# Altium footprint library Connectors THD.PcbLib: 631 footprints (part 24 of 46)
Each footprint in its own frame and in the unit in brackets; x right, y up, seen from the top. Pads: shape width x height; smd on the part's side, far side on the other; paste and mask are expansions set on the pad; w line width, h text height; cw(c..) or ccw(c..) is an arc to the next point about the centre after c.
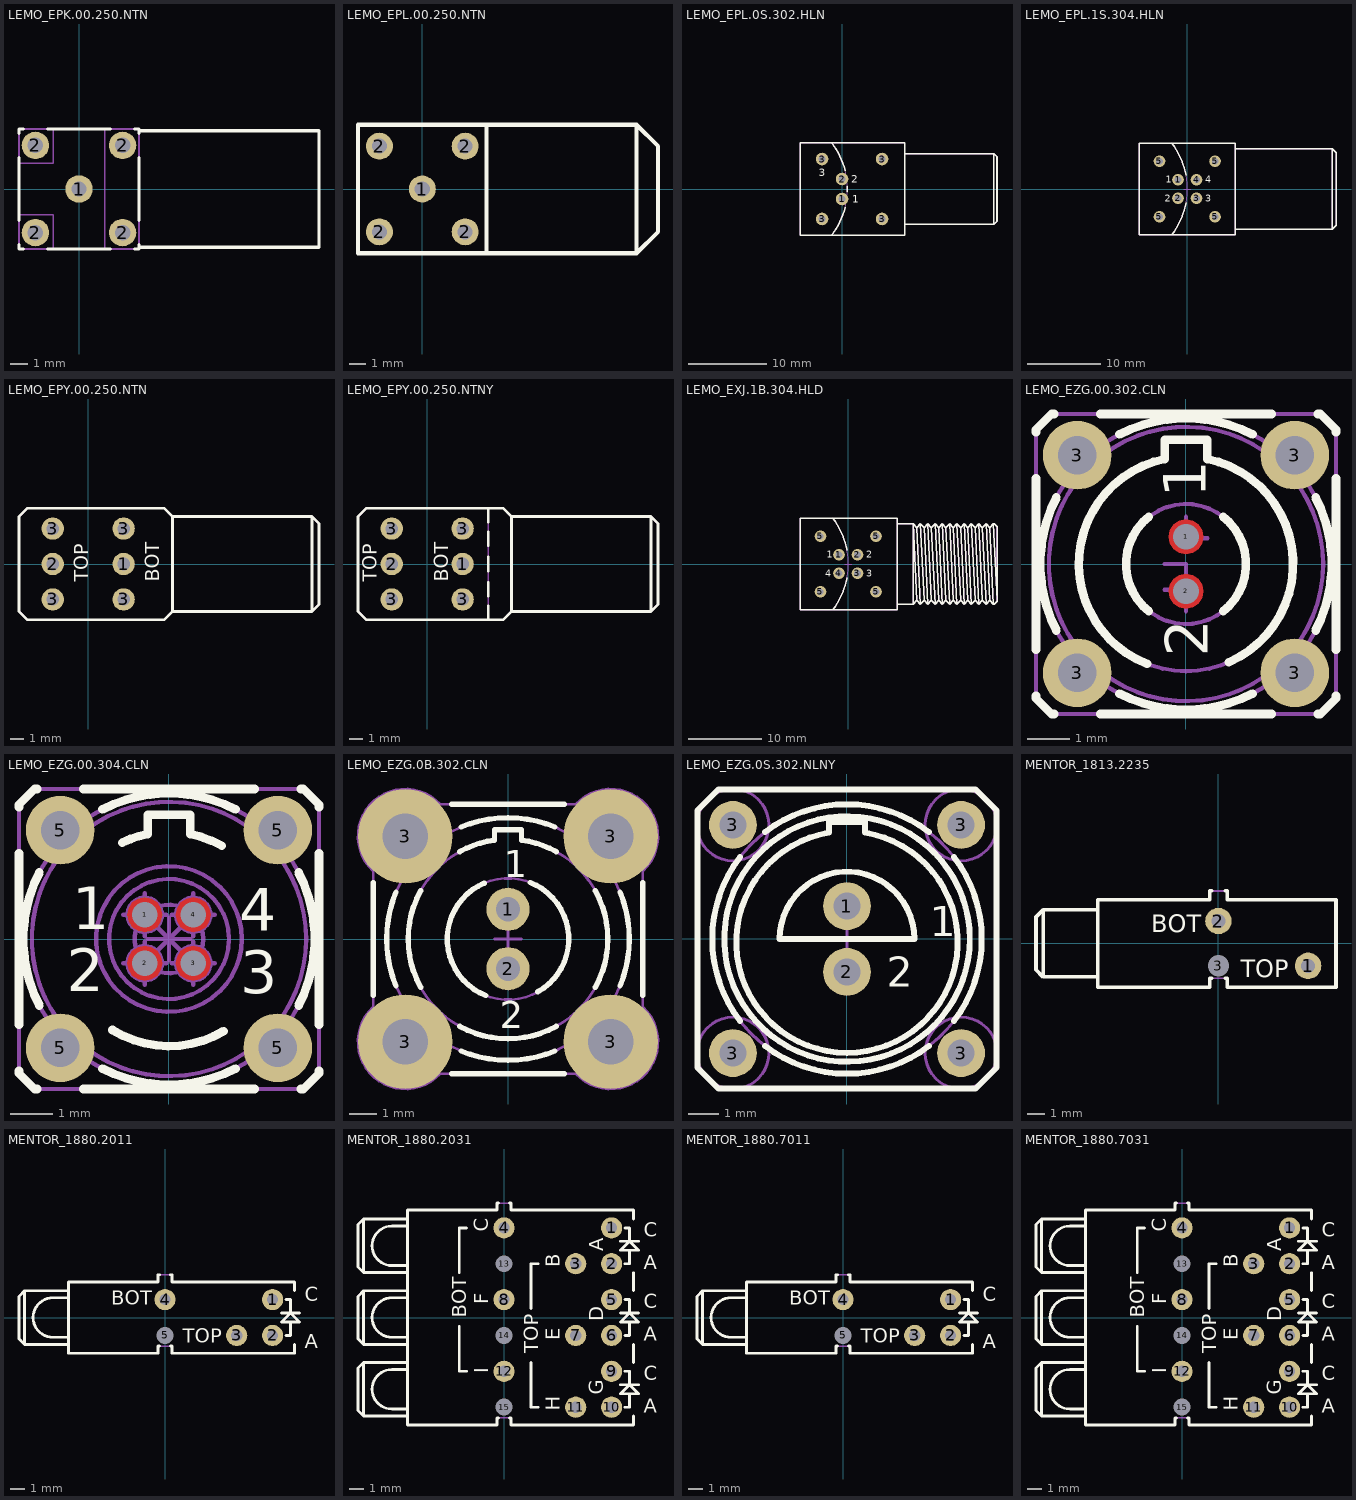
[diagram p23: the footprints below, top view; thin cyan lines are the x and y axes]

## LEMO_EPK.00.250.NTN [mm] "50 Ohm size 00 Coaxial Elbow (90°) socket"
height 7
pads (5):
  round 1.6 hole 0.9: 1(0,0) 2(-2.54,-2.54) 2(-2.54,2.54) 2(2.54,-2.54) 2(2.54,2.54)
Top Overlay:
  lines w0.2: -3.5,-3.26 -3.5,-3.5 -3.26,-3.5 ; -3.5,-1.82 -3.5,1.82 ; -3.5,3.26 -3.5,3.5 -3.26,3.5 ; -1.82,-3.5 1.82,-3.5 ; -1.82,3.5 1.82,3.5 ; 3.26,-3.5 3.5,-3.5 3.5,-3.26 ; 3.26,3.5 3.5,3.5 3.5,3.26 ; 3.5,-3.4 14,-3.4 14,3.4 3.5,3.4 ; 3.5,-1.82 3.5,1.82
Mechanical 8:
  lines w0.1: -3.04,-2.54 -2.54,-2.54 ; -3.04,2.54 -2.54,2.54 ; -2.54,-3.04 -2.54,-2.54 ; -2.54,-2.04 -2.54,-2.54 ; -2.54,2.04 -2.54,2.54 ; -2.54,3.04 -2.54,2.54 ; -2.04,-2.54 -2.54,-2.54 ; -2.04,2.54 -2.54,2.54 ; -0.5,0 0,0 ; 0,-0.5 0,0 ; 0,0.5 0,0 ; 0.5,0 0,0 ; 2.04,-2.54 2.54,-2.54 ; 2.04,2.54 2.54,2.54 ; 2.54,-3.04 2.54,-2.54 ; 2.54,-2.04 2.54,-2.54 ; 2.54,2.04 2.54,2.54 ; 2.54,3.04 2.54,2.54 ; 3.04,-2.54 2.54,-2.54 ; 3.04,2.54 2.54,2.54 ; -3.5,-3.5 -3.5,-1.5 -1.5,-1.5 -1.5,-3.5 -3.5,-3.5 ; -3.5,1.5 -3.5,3.5 -1.5,3.5 -1.5,1.5 -3.5,1.5 ; 1.5,-3.5 3.5,-3.5 3.5,3.5 1.5,3.5 1.5,-3.5
Mechanical 14:
  lines w0.1: 1.5,-3.5 3.5,-3.5 ; 3.5,-3.4 14,-3.4 14,3.4 3.5,3.4 ; 3.5,-3.5 3.5,3.5 ; 3.5,-3.5 -3.5,-3.5 -3.5,3.5 3.5,3.5 ; 3.5,-3.5 3.5,3.5
3D body: height 7, standoff -3, extent -3.5,-3.5 14,3.5

## LEMO_EPL.00.250.NTN [mm] "50 Ohm size 00 Coaxial Elbow (90°) socket"
height 7
pads (5):
  round 1.6 hole 0.9: 1(0,0) 2(-2.54,-2.54) 2(-2.54,2.54) 2(2.54,-2.54) 2(2.54,2.54)
Top Overlay:
  lines w0.254: 3.81,-3.81 -3.81,-3.81 -3.81,3.81 3.81,3.81 ; 3.81,-3.81 3.81,3.81 ; 3.81,-3.81 12.7,-3.81 ; 3.81,3.81 12.7,3.81 ; 12.7,-3.81 12.7,3.81 ; 12.7,-3.81 13.97,-2.54 13.97,2.54 12.7,3.81
Mechanical 14:
  lines w0.1: 3.81,-3.81 12.7,-3.81 ; 3.81,-3.81 -3.81,-3.81 -3.81,3.81 3.81,3.81 ; 3.81,-3.81 3.81,3.81 ; 3.81,3.81 12.7,3.81 ; 12.7,-3.81 12.7,3.81 ; 12.7,-3.81 13.97,-2.54 13.97,2.54 12.7,3.81
3D body: height 7, standoff -3, extent -3.5,-3.5 14,3.5

## LEMO_EPL.0S.302.HLN [mm] "Elbow Receptacle (90°) With 1 Female + 1 Male Contacts and Hermaphroditic Keying"
height 12.7
pads (6):
  round 1.6 hole 0.9: 1(0,-1.27) 2(0,1.27) 3(-2.54,-3.81) 3(-2.54,3.81) 3(5.08,-3.81) 3(5.08,3.81)
Top Overlay:
  lines w0.2: -1.32,-5.85 ccw(c-8.876,0) 0.386,-2.353 ; -1.32,5.85 cw(c-8.876,0) 0.386,2.353 ; 0.674,-0.338 ccw(c-8.876,0) 0.674,0.338 ; 7.98,-4.5 19.28,-4.5 ; 7.98,4.5 19.28,4.5 ; 19.28,-4.5 19.68,-4.1 19.68,4.1 19.28,4.5 ; 19.28,-4.5 19.28,4.5 ; -5.32,-5.85 -5.32,5.85 7.98,5.85 7.98,-5.85 -5.32,-5.85
  text "3" at -2.975,1.625 h0.97
  text "2" at 1.186,0.787 h0.97
  text "1" at 1.275,-1.75 h0.97
Mechanical 14:
  circle w0.1: c0,1.27 r0.4
  circle w0.1: c0,-1.27 r0.4
  circle w0.1: c-2.54,-3.81 r0.4
  circle w0.1: c5.08,-3.81 r0.4
  circle w0.1: c5.08,3.81 r0.4
  circle w0.1: c-2.54,3.81 r0.4
  lines w0.1: -1.32,-5.85 ccw(c-8.876,0) -1.32,5.85 ; 7.98,-4.5 19.28,-4.5 ; 7.98,4.5 19.28,4.5 ; 19.28,-4.5 19.68,-4.1 19.68,4.1 19.28,4.5 ; 19.28,-4.5 19.28,4.5 ; -5.32,-5.85 -5.32,5.85 7.98,5.85 7.98,-5.85 -5.32,-5.85
  text "3" at -2.975,1.625 h0.97
  text "2" at 1.186,0.787 h0.97
  text "1" at 1.275,-1.75 h0.97
3D body: height 12.7, standoff -4, extent -5.32,-5.85 19.68,5.85

## LEMO_EPL.1S.304.HLN [mm] "Elbow Socket (90°) With 2 Female + 2 Male Contacts For PCB, Serie 1S"
height 14
pads (8):
  round 1.6 hole 0.9: 1(-1.27,1.27) 2(-1.27,-1.27) 3(1.27,-1.27) 4(1.27,1.27) 5(-3.81,-3.81) 5(-3.81,3.81) 5(3.81,-3.81) 5(3.81,3.81)
Top Overlay:
  lines w0.2: -2.132,-6.3 ccw(c-10.375,0) -0.169,-1.861 ; -2.132,6.3 cw(c-10.375,0) -0.169,1.861 ; 6.6,-5.5 19.9,-5.5 ; 6.6,5.5 19.9,5.5 ; 19.9,-5.5 20.4,-5 20.4,5 19.9,5.5 ; 19.9,-5.5 19.9,5.5 ; -6.6,-6.3 -6.6,6.3 6.6,6.3 6.6,-6.3 -6.6,-6.3
  text "1" at -2.932,0.827 h0.97
  text "4" at 2.48,0.827 h0.97
  text "2" at -3.12,-1.748 h0.97
  text "3" at 2.477,-1.717 h0.97
Mechanical 8:
  lines w0.1: -4.31,-3.81 -3.81,-3.81 ; -4.31,3.81 -3.81,3.81 ; -3.81,-4.31 -3.81,-3.81 ; -3.81,-3.31 -3.81,-3.81 ; -3.81,3.31 -3.81,3.81 ; -3.81,4.31 -3.81,3.81 ; -3.31,-3.81 -3.81,-3.81 ; -3.31,3.81 -3.81,3.81 ; -1.77,-1.27 -1.27,-1.27 ; -1.77,1.27 -1.27,1.27 ; -1.27,-1.77 -1.27,-1.27 ; -1.27,-0.77 -1.27,-1.27 ; -1.27,0.77 -1.27,1.27 ; -1.27,1.77 -1.27,1.27 ; -0.77,-1.27 -1.27,-1.27 ; -0.77,1.27 -1.27,1.27 ; -0.5,0 0,0 ; 0,-0.5 0,0 ; 0,0.5 0,0 ; 0.5,0 0,0 ; 0.77,-1.27 1.27,-1.27 ; 0.77,1.27 1.27,1.27 ; 1.27,-1.77 1.27,-1.27 ; 1.27,-0.77 1.27,-1.27 ; 1.27,0.77 1.27,1.27 ; 1.27,1.77 1.27,1.27 ; 1.77,-1.27 1.27,-1.27 ; 1.77,1.27 1.27,1.27 ; 3.31,-3.81 3.81,-3.81 ; 3.31,3.81 3.81,3.81 ; 3.81,-4.31 3.81,-3.81 ; 3.81,-3.31 3.81,-3.81 ; 3.81,3.31 3.81,3.81 ; 3.81,4.31 3.81,3.81 ; 4.31,-3.81 3.81,-3.81 ; 4.31,3.81 3.81,3.81
Mechanical 14:
  lines w0.1: -2.132,-6.3 ccw(c-10.375,0) -2.132,6.3 ; 6.6,-5.5 19.9,-5.5 ; 6.6,5.5 19.9,5.5 ; 19.9,-5.5 20.4,-5 20.4,5 19.9,5.5 ; 19.9,-5.5 19.9,5.5 ; -6.6,-6.3 -6.6,6.3 6.6,6.3 6.6,-6.3 -6.6,-6.3
  text "1" at -2.932,0.827 h0.97
  text "4" at 2.48,0.827 h0.97
  text "2" at -3.12,-1.748 h0.97
  text "3" at 2.477,-1.717 h0.97
3D body: height 14, standoff -4, extent -6.6,-6.3 20.4,6.3

## LEMO_EPY.00.250.NTN [mm] "Dual 50 ohms Size 00 Coaxial Elbow Sockets (90°)"
height 14.8
pads (6):
  round 1.6 hole 0.9: 1(2.54,0) 2(-2.54,0) 3(-2.54,-2.54) 3(-2.54,2.54) 3(2.54,-2.54) 3(2.54,2.54)
Top Overlay:
  lines w0.2: 6.04,-3.4 16.04,-3.4 ; 6.04,-3.4 6.04,3.4 ; 6.04,-3.4 5.44,-4 -4.36,-4 -4.96,-3.4 -4.96,3.4 -4.36,4 5.44,4 6.04,3.4 ; 6.04,3.4 16.04,3.4 ; 16.04,-3.4 16.04,3.4 ; 16.04,-3.4 16.54,-2.9 16.54,2.9 16.04,3.4
  text "TOP" at 0,-1.27 h1
  text "BOT" at 5.08,-1.27 h1
Mechanical 14:
  lines w0.1: 6.04,-3.4 16.04,-3.4 ; 6.04,-3.4 6.04,3.4 ; 6.04,-3.4 5.44,-4 -4.36,-4 -4.96,-3.4 -4.96,3.4 -4.36,4 5.44,4 6.04,3.4 ; 6.04,3.4 16.04,3.4 ; 16.04,-3.4 16.04,3.4 ; 16.04,-3.4 16.54,-2.9 16.54,2.9 16.04,3.4
  text "TOP" at 0,-1.27 h1
  text "BOT" at 5.08,-1.27 h1
3D body: height 14.8, standoff -3, extent -4.96,-4 16.54,4

## LEMO_EPY.00.250.NTNY [mm] "Dual 50 ohms Low Profile Size 00 Coaxial Elbow Sockets (90°)"
height 13.7
pads (6):
  round 1.6 hole 0.9: 1(2.54,0) 2(-2.54,0) 3(-2.54,-2.54) 3(-2.54,2.54) 3(2.54,-2.54) 3(2.54,2.54)
Top Overlay:
  lines w0.2: 4.37,-4 4.37,-3 ; 4.37,-2.318 4.37,-1.318 ; 4.37,-0.5 4.37,0.5 ; 4.37,1.318 4.37,2.318 ; 4.37,3 4.37,4 ; 6.04,-3.4 5.44,-4 -4.36,-4 -4.96,-3.4 -4.96,3.4 -4.36,4 5.44,4 6.04,3.4 ; 6.04,-3.4 6.04,3.4 ; 6.04,-3.4 16.04,-3.4 ; 6.04,3.4 16.04,3.4 ; 16.04,-3.4 16.54,-2.9 16.54,2.9 16.04,3.4 ; 16.04,-3.4 16.04,3.4
  text "BOT" at 1.51,-1.27 h1
  text "TOP" at -3.6,-1.27 h1
Mechanical 14:
  lines w0.1: 4.37,-4 4.37,4 ; 6.04,-3.4 5.44,-4 -4.36,-4 -4.96,-3.4 -4.96,3.4 -4.36,4 5.44,4 6.04,3.4 ; 6.04,-3.4 6.04,3.4 ; 6.04,-3.4 16.04,-3.4 ; 6.04,3.4 16.04,3.4 ; 16.04,-3.4 16.54,-2.9 16.54,2.9 16.04,3.4 ; 16.04,-3.4 16.04,3.4
  text "BOT" at 1.51,-1.27 h1
  text "TOP" at -3.6,-1.27 h1
3D body: height 13.7, standoff -3, extent -4.96,-4 16.54,4

## LEMO_EXJ.1B.304.HLD [mm] "Elbow Socket (90°) With 4 Male Contacts For PCB And Keys (J), Serie 1B"
height 14
pads (8):
  round 1.6 hole 0.9: 1(-1.27,1.27) 2(1.27,1.27) 3(1.27,-1.27) 4(-1.27,-1.27) 5(-3.81,-3.81) 5(-3.81,3.81) 5(3.81,-3.81) 5(3.81,3.81)
Top Overlay:
  lines w0.2: -2.132,-6.3 ccw(c-10.375,0) -0.169,-1.861 ; -2.132,6.3 cw(c-10.375,0) -0.169,1.861 ; 6.71,-5.5 8.91,-5.5 ; 6.71,5.5 8.91,5.5 ; 20.41,-5 19.91,5.5 ; 8.91,-5.5 9.41,-5 ; 8.91,-5.5 8.91,5.5 ; 8.91,5.5 9.41,5 ; 8.91,5.5 9.41,-5 ; 9.41,-5 9.91,-5.5 ; 9.41,5 9.91,5.5 ; 9.41,5 9.91,-5.5 ; 9.91,-5.5 10.41,-5 ; 9.91,5.5 10.41,5 ; 9.91,5.5 10.41,-5 ; 10.41,-5 10.91,-5.5 ; 10.41,5 10.91,5.5 ; 10.41,5 10.91,-5.5 ; 10.91,-5.5 11.41,-5 ; 10.91,5.5 11.41,5 ; 10.91,5.5 11.41,-5 ; 11.41,-5 11.91,-5.5 ; 11.41,5 11.91,5.5 ; 11.41,5 11.91,-5.5 ; 11.91,-5.5 12.41,-5 ; 11.91,5.5 12.41,5 ; 11.91,5.5 12.41,-5 ; 12.41,-5 12.91,-5.5 ; 12.41,5 12.91,5.5 ; 12.41,5 12.91,-5.5 ; 12.91,-5.5 13.41,-5 ; 12.91,5.5 13.41,5 ; 12.91,5.5 13.41,-5 ; 13.41,-5 13.91,-5.5 ; 13.41,5 13.91,5.5 ; 13.41,5 13.91,-5.5 ; 13.91,-5.5 14.41,-5 ; 13.91,5.5 14.41,5 ; 13.91,5.5 14.41,-5 ; 14.41,-5 14.91,-5.5 ; 14.41,5 14.91,5.5 ; 14.41,5 14.91,-5.5 ; 14.91,-5.5 15.41,-5 ; 14.91,5.5 15.41,5 ; 14.91,5.5 15.41,-5 ; 15.41,-5 15.91,-5.5 ; 15.41,5 15.91,5.5 ; 15.41,5 15.91,-5.5 ; 15.91,-5.5 16.41,-5 ; 15.91,5.5 16.41,5 ; 15.91,5.5 16.41,-5 ; 16.41,-5 16.91,-5.5 ; 16.41,5 16.91,5.5 ; 16.41,5 16.91,-5.5 ; 16.91,-5.5 17.41,-5 ; 16.91,5.5 17.41,5 ; 16.91,5.5 17.41,-5 ; 17.41,-5 17.91,-5.5 ; 17.41,5 17.91,5.5 ; 17.41,5 17.91,-5.5 ; 17.91,-5.5 18.41,-5 ; 17.91,5.5 18.41,5 ; 17.91,5.5 18.41,-5 ; 18.41,-5 18.91,-5.5 ; 18.41,5 18.91,5.5 ; 18.41,5 18.91,-5.5 ; 18.91,-5.5 19.41,-5 ; 18.91,5.5 19.41,5 ; 18.91,5.5 19.41,-5 ; 19.41,-5 19.91,-5.5 ; 19.41,5 19.91,5.5 ; 19.41,5 19.91,-5.5 ; 19.91,-5.5 20.01,-5.5 20.41,-5.1 20.41,5.1 20.01,5.5 19.91,5.5 ; -6.59,-6.3 6.71,-6.3 6.71,6.3 -6.59,6.3 -6.59,-6.3
  text "1" at -2.932,0.827 h0.97
  text "2" at 2.48,0.827 h0.97
  text "4" at -3.12,-1.748 h0.97
  text "3" at 2.477,-1.717 h0.97
Mechanical 8:
  lines w0.1: -4.31,-3.81 -3.81,-3.81 ; -4.31,3.81 -3.81,3.81 ; -3.81,-4.31 -3.81,-3.81 ; -3.81,-3.31 -3.81,-3.81 ; -3.81,3.31 -3.81,3.81 ; -3.81,4.31 -3.81,3.81 ; -3.31,-3.81 -3.81,-3.81 ; -3.31,3.81 -3.81,3.81 ; -1.77,-1.27 -1.27,-1.27 ; -1.77,1.27 -1.27,1.27 ; -1.27,-1.77 -1.27,-1.27 ; -1.27,-0.77 -1.27,-1.27 ; -1.27,0.77 -1.27,1.27 ; -1.27,1.77 -1.27,1.27 ; -0.77,-1.27 -1.27,-1.27 ; -0.77,1.27 -1.27,1.27 ; -0.5,0 0,0 ; 0,-0.5 0,0 ; 0,0.5 0,0 ; 0.5,0 0,0 ; 0.77,-1.27 1.27,-1.27 ; 0.77,1.27 1.27,1.27 ; 1.27,-1.77 1.27,-1.27 ; 1.27,-0.77 1.27,-1.27 ; 1.27,0.77 1.27,1.27 ; 1.27,1.77 1.27,1.27 ; 1.77,-1.27 1.27,-1.27 ; 1.77,1.27 1.27,1.27 ; 3.31,-3.81 3.81,-3.81 ; 3.31,3.81 3.81,3.81 ; 3.81,-4.31 3.81,-3.81 ; 3.81,-3.31 3.81,-3.81 ; 3.81,3.31 3.81,3.81 ; 3.81,4.31 3.81,3.81 ; 4.31,-3.81 3.81,-3.81 ; 4.31,3.81 3.81,3.81
Mechanical 14:
  lines w0.1: -2.132,-6.3 ccw(c-10.375,0) -2.132,6.3 ; 6.71,-5.5 8.91,-5.5 ; 6.71,5.5 8.91,5.5 ; 20.41,-5 19.91,5.5 ; 8.91,-5.5 9.41,-5 ; 8.91,-5.5 8.91,5.5 ; 8.91,5.5 9.41,5 ; 8.91,5.5 9.41,-5 ; 9.41,-5 9.91,-5.5 ; 9.41,5 9.91,5.5 ; 9.41,5 9.91,-5.5 ; 9.91,-5.5 10.41,-5 ; 9.91,5.5 10.41,5 ; 9.91,5.5 10.41,-5 ; 10.41,-5 10.91,-5.5 ; 10.41,5 10.91,5.5 ; 10.41,5 10.91,-5.5 ; 10.91,-5.5 11.41,-5 ; 10.91,5.5 11.41,5 ; 10.91,5.5 11.41,-5 ; 11.41,-5 11.91,-5.5 ; 11.41,5 11.91,5.5 ; 11.41,5 11.91,-5.5 ; 11.91,-5.5 12.41,-5 ; 11.91,5.5 12.41,5 ; 11.91,5.5 12.41,-5 ; 12.41,-5 12.91,-5.5 ; 12.41,5 12.91,5.5 ; 12.41,5 12.91,-5.5 ; 12.91,-5.5 13.41,-5 ; 12.91,5.5 13.41,5 ; 12.91,5.5 13.41,-5 ; 13.41,-5 13.91,-5.5 ; 13.41,5 13.91,5.5 ; 13.41,5 13.91,-5.5 ; 13.91,-5.5 14.41,-5 ; 13.91,5.5 14.41,5 ; 13.91,5.5 14.41,-5 ; 14.41,-5 14.91,-5.5 ; 14.41,5 14.91,5.5 ; 14.41,5 14.91,-5.5 ; 14.91,-5.5 15.41,-5 ; 14.91,5.5 15.41,5 ; 14.91,5.5 15.41,-5 ; 15.41,-5 15.91,-5.5 ; 15.41,5 15.91,5.5 ; 15.41,5 15.91,-5.5 ; 15.91,-5.5 16.41,-5 ; 15.91,5.5 16.41,5 ; 15.91,5.5 16.41,-5 ; 16.41,-5 16.91,-5.5 ; 16.41,5 16.91,5.5 ; 16.41,5 16.91,-5.5 ; 16.91,-5.5 17.41,-5 ; 16.91,5.5 17.41,5 ; 16.91,5.5 17.41,-5 ; 17.41,-5 17.91,-5.5 ; 17.41,5 17.91,5.5 ; 17.41,5 17.91,-5.5 ; 17.91,-5.5 18.41,-5 ; 17.91,5.5 18.41,5 ; 17.91,5.5 18.41,-5 ; 18.41,-5 18.91,-5.5 ; 18.41,5 18.91,5.5 ; 18.41,5 18.91,-5.5 ; 18.91,-5.5 19.41,-5 ; 18.91,5.5 19.41,5 ; 18.91,5.5 19.41,-5 ; 19.41,-5 19.91,-5.5 ; 19.41,5 19.91,5.5 ; 19.41,5 19.91,-5.5 ; 19.91,-5.5 20.01,-5.5 20.41,-5.1 20.41,5.1 20.01,5.5 19.91,5.5 ; -6.59,-6.3 6.71,-6.3 6.71,6.3 -6.59,6.3 -6.59,-6.3
  text "1" at -2.932,0.827 h0.97
  text "2" at 2.48,0.827 h0.97
  text "4" at -3.12,-1.748 h0.97
  text "3" at 2.477,-1.717 h0.97
3D body: height 14, standoff -3.2, extent -6.59,-6.3 20.41,6.3
3D body: height 15.5, standoff -0.5, extent 8.91,-8 12.41,8
3D body: height 14.44, standoff 0.56, extent 16.91,-6.942 20.41,6.942

## LEMO_EZG.00.302.CLN [mm] "Size 00, Straight Receptacle with 2 Female Contacts and Alignment Key (G)"
height 14
pads (6):
  round 0.2 / inner rrect50% 1.1x1.1 / far side rrect50% 1.1x1.1 hole 0.6 copper offset 0,0.05: 1(0,0.635)
  round 0.2 / inner rrect50% 1.1x1.1 / far side rrect50% 1.1x1.1 hole 0.6 copper offset 0,-0.05: 2(0,-0.635)
  round 1.6 hole 0.9: 3(-2.54,-2.54) 3(-2.54,2.54) 3(2.54,-2.54) 3(2.54,2.54)
Top Layer:
  region: 0,-1.043 -0.156,-1.012 -0.288,-0.923 -0.377,-0.791 -0.408,-0.635 -0.377,-0.479 -0.288,-0.347 -0.156,-0.258 0,-0.227 0.156,-0.258 0.288,-0.347 0.377,-0.479 0.408,-0.635 0.377,-0.791 0.288,-0.923 0.156,-1.012
  region: 0,0.227 -0.156,0.258 -0.288,0.347 -0.377,0.479 -0.408,0.635 -0.377,0.791 -0.288,0.923 -0.156,1.012 0,1.043 0.156,1.012 0.288,0.923 0.377,0.791 0.408,0.635 0.377,0.479 0.288,0.347 0.156,0.258
Top Overlay:
  lines w0.2: -3.5,-3.077 -3.5,-3.137 -3.137,-3.5 -3.077,-3.5 ; -3.5,-2.003 -3.5,2.003 ; -3.5,3.077 -3.5,3.137 -3.137,3.5 -3.077,3.5 ; -3.025,-1.553 cw(c0,0) -3.025,1.553 ; -2.003,-3.5 2.003,-3.5 ; -2.003,3.5 2.003,3.5 ; -1.553,-3.025 ccw(c0,0) 1.553,-3.025 ; -1.553,3.025 cw(c0,0) 1.553,3.025 ; -0.906,-2.33 cw(c0,0) -0.5,2.449 -0.5,2.9 0.5,2.9 0.5,2.449 cw(c0,0) 1.002,-2.29 ; -0.866,-1.1 cw(c0,0) -0.866,1.1 ; 0.866,-1.1 ccw(c0,0) 0.866,1.1 ; 3.025,-1.553 ccw(c0,0) 3.025,1.553 ; 3.077,-3.5 3.137,-3.5 3.5,-3.137 3.5,-3.077 ; 3.077,3.5 3.137,3.5 3.5,3.137 3.5,3.077 ; 3.5,-2.003 3.5,2.003
  text "1" at 0.457,1.548 h1
  text "2" at 0.508,-2.159 h1
Mechanical 8:
  lines w0.1: -3.04,-2.54 -2.54,-2.54 -2.54,-3.04 ; -3.04,2.54 -2.54,2.54 -2.54,3.04 ; -0.5,-0.6 0,-0.6 0,-1.1 ; -0.5,0 0,0 0,-0.5 ; 0,1.1 0,0.6 0.5,0.6 ; 2.54,-3.04 2.54,-2.54 3.04,-2.54 ; 2.54,3.04 2.54,2.54 3.04,2.54
Mechanical 14:
  circle w0.1: c0,0 r3.4
  circle w0.1: c0,0 r3.2
  circle w0.1: c0,0 r1.4
  lines w0.1: -3.5,-3.137 -3.137,-3.5 3.137,-3.5 3.5,-3.137 3.5,3.137 3.137,3.5 -3.137,3.5 -3.5,3.137 -3.5,-3.137 ; -0.5,2.449 ccw(c0,0) 0.5,2.449 0.5,2.9 -0.5,2.9 -0.5,2.449
  text "1" at 0.457,1.548 h1
  text "2" at 0.508,-2.159 h1
3D body: height 14, standoff -3, extent -3.5,-3.5 3.501,3.502

## LEMO_EZG.00.304.CLN [mm] "Size 00, Straight Receptacle with 4 Female Contacts and Alignment Key (G)"
height 14
pads (8):
  round 0.2 / inner rrect50% 1.1x1.1 / far side rrect50% 1.1x1.1 hole 0.6 copper offset -0.1,0.1: 1(-0.566,0.566)
  rrect50% 0.2x0.2 / inner rrect50% 1.1x1.1 / far side rrect50% 1.1x1.1 hole 0.6 copper offset -0.1,-0.1: 2(-0.566,-0.566)
  rrect50% 0.2x0.2 / inner rrect50% 1.1x1.1 / far side rrect50% 1.1x1.1 hole 0.6 copper offset 0.1,-0.1: 3(0.566,-0.566)
  rrect50% 0.2x0.2 / inner rrect50% 1.1x1.1 / far side rrect50% 1.1x1.1 hole 0.6 copper offset 0.1,0.1: 4(0.566,0.566)
  round 1.6 hole 0.9: 5(-2.54,-2.54) 5(-2.54,2.54) 5(2.54,-2.54) 5(2.54,2.54)
Top Layer:
  region: -0.566,0.158 -0.722,0.189 -0.854,0.277 -0.942,0.41 -0.973,0.566 -0.942,0.722 -0.854,0.854 -0.722,0.942 -0.566,0.974 -0.41,0.942 -0.277,0.854 -0.189,0.722 -0.158,0.566 -0.189,0.41 -0.277,0.277 -0.41,0.189
  region: 0.566,0.158 0.41,0.189 0.277,0.277 0.189,0.41 0.158,0.566 0.189,0.722 0.277,0.854 0.41,0.942 0.566,0.974 0.722,0.942 0.854,0.854 0.943,0.722 0.974,0.566 0.943,0.41 0.854,0.277 0.722,0.189
  region: 0.566,-0.974 0.41,-0.942 0.277,-0.854 0.189,-0.722 0.158,-0.566 0.189,-0.41 0.277,-0.277 0.41,-0.189 0.566,-0.158 0.722,-0.189 0.854,-0.277 0.943,-0.41 0.974,-0.566 0.943,-0.722 0.854,-0.854 0.722,-0.942
  region: -0.566,-0.974 -0.722,-0.942 -0.854,-0.854 -0.942,-0.722 -0.973,-0.566 -0.942,-0.41 -0.854,-0.277 -0.722,-0.189 -0.566,-0.158 -0.41,-0.189 -0.277,-0.277 -0.189,-0.41 -0.158,-0.566 -0.189,-0.722 -0.277,-0.854 -0.41,-0.942
Bottom Layer:
  region: -0.566,0.158 -0.722,0.189 -0.854,0.277 -0.942,0.41 -0.973,0.566 -0.942,0.722 -0.854,0.854 -0.722,0.942 -0.566,0.974 -0.41,0.942 -0.277,0.854 -0.189,0.722 -0.158,0.566 -0.189,0.41 -0.277,0.277 -0.41,0.189
Top Overlay:
  lines w0.2: -3.5,-3.077 -3.5,-3.137 -3.137,-3.5 -3.077,-3.5 ; -3.5,-2.003 -3.5,2.003 ; -3.5,3.077 -3.5,3.137 -3.137,3.5 -3.077,3.5 ; -3.025,-1.553 cw(c0,0) -3.025,1.553 ; -2.003,-3.5 2.003,-3.5 ; -2.003,3.5 2.003,3.5 ; -1.553,-3.025 ccw(c0,0) 1.553,-3.025 ; -1.553,3.025 cw(c0,0) 1.553,3.025 ; -1.319,-2.124 ccw(c0,0) 1.279,-2.148 ; -1.09,2.25 cw(c0,0) -0.5,2.449 -0.5,2.9 0.5,2.9 0.5,2.449 cw(c0,0) 1.235,2.174 ; 3.025,-1.553 ccw(c0,0) 3.025,1.553 ; 3.077,-3.5 3.137,-3.5 3.5,-3.137 3.5,-3.077 ; 3.077,3.5 3.137,3.5 3.5,3.137 3.5,3.077 ; 3.5,-2.003 3.5,2.003
  text "2" at -2.387,-1.217 h1
  text "3" at 1.658,-1.261 h1
  text "4" at 1.638,0.188 h1
  text "1" at -2.262,0.233 h1
Mechanical 8:
  circle w0.1: c0,0 r1.4
  circle w0.1: c0,0 r0.8
  lines w0.1: -3.04,-2.54 -2.54,-2.54 ; -3.04,2.54 -2.54,2.54 ; -2.54,-3.04 -2.54,-2.54 ; -2.54,-2.04 -2.54,-2.54 ; -2.54,2.04 -2.54,2.54 ; -2.54,3.04 -2.54,2.54 ; -2.04,-2.54 -2.54,-2.54 ; -2.04,2.54 -2.54,2.54 ; -1.066,-0.566 -0.566,-0.566 ; -1.066,0.566 -0.566,0.566 ; -0.566,-1.066 -0.566,-0.566 ; -0.566,-0.066 -0.566,-0.566 ; -0.566,0.066 -0.566,0.566 ; -0.566,1.066 -0.566,0.566 ; -0.5,0 0,0 ; -0.066,-0.566 -0.566,-0.566 ; -0.066,0.566 -0.566,0.566 ; 0,-0.5 0,0 ; 0,0.5 0,0 ; 0.066,-0.566 0.566,-0.566 ; 0.066,0.566 0.566,0.566 ; 0.5,0 0,0 ; 0.566,-1.066 0.566,-0.566 ; 0.566,-0.066 0.566,-0.566 ; 0.566,0.066 0.566,0.566 ; 0.566,1.066 0.566,0.566 ; 1.066,-0.566 0.566,-0.566 ; 1.066,0.566 0.566,0.566 ; 2.04,-2.54 2.54,-2.54 ; 2.04,2.54 2.54,2.54 ; 2.54,-3.04 2.54,-2.54 ; 2.54,-2.04 2.54,-2.54 ; 2.54,2.04 2.54,2.54 ; 2.54,3.04 2.54,2.54 ; 3.04,-2.54 2.54,-2.54 ; 3.04,2.54 2.54,2.54 ; -0.566,-0.566 0.566,0.566 ; -0.566,0.566 0.566,-0.566
Mechanical 14:
  circle w0.1: c0,0 r1.7
  circle w0.1: c0,0 r3.4
  circle w0.1: c0,0 r3.2
  circle w0.1: c0.566,0.566 r0.4
  circle w0.1: c0.566,0.566 r0.2
  circle w0.1: c0.566,-0.566 r0.2
  circle w0.1: c0.566,-0.566 r0.4
  circle w0.1: c-0.566,-0.566 r0.2
  circle w0.1: c-0.566,-0.566 r0.4
  circle w0.1: c-0.566,0.566 r0.4
  circle w0.1: c-0.566,0.566 r0.2
  lines w0.1: -1.319,-2.124 ccw(c0,0) 1.279,-2.148 ; -1.09,2.25 cw(c0,0) -0.5,2.449 -0.5,2.9 0.5,2.9 0.5,2.449 cw(c0,0) 1.235,2.174 ; -3.5,-3.137 -3.5,3.137 -3.137,3.5 3.137,3.5 3.5,3.137 3.5,-3.137 3.137,-3.5 -3.137,-3.5 -3.5,-3.137
  text "2" at -2.387,-1.217 h1
  text "3" at 1.658,-1.261 h1
  text "4" at 1.638,0.188 h1
  text "1" at -2.262,0.233 h1
3D body: height 14, standoff -3, extent -3.5,-3.5 3.501,3.503

## LEMO_EZG.0B.302.CLN [mm] "Size 0B, Straight Receptacle with 2 Female Contacts and Alignment Key (G)"
height 15
pads (6):
  round 1.6 hole 0.9: 1(0,1.1) 2(0,-1.1)
  round 3.5 hole 1.7: 3(-3.81,-3.81) 3(-3.81,3.81) 3(3.81,-3.81) 3(3.81,3.81)
Top Overlay:
  lines w0.2: -5,-2.08 -5,2.08 ; -4.151,-1.738 cw(c0,0) -4.151,1.738 ; -3.239,-1.789 cw(c0,0) -3.239,1.789 ; -2.08,-5 2.08,-5 ; -2.08,5 2.08,5 ; -1.789,-3.239 ccw(c0,0) 1.789,-3.239 ; -1.789,3.239 cw(c0,0) -0.5,3.666 -0.5,4.05 0.5,4.05 0.5,3.666 cw(c0,0) 1.789,3.239 ; -1.738,-4.151 ccw(c0,0) 1.738,-4.151 ; -1.738,4.151 cw(c0,0) 1.738,4.151 ; -0.883,2.069 ccw(c0,0) -0.827,-2.093 ; 0.823,2.094 cw(c0,0) 1.103,-1.961 ; 3.239,-1.789 ccw(c0,0) 3.239,1.789 ; 4.151,-1.738 ccw(c0,0) 4.151,1.738 ; 5,-2.08 5,2.08
  text "2" at -0.299,-3.308 h1
  text "1" at -0.162,2.293 h1
Mechanical 8:
  lines w0.1: -4.31,-3.81 -3.81,-3.81 ; -4.31,3.81 -3.81,3.81 ; -3.81,-4.31 -3.81,-3.81 ; -3.81,-3.31 -3.81,-3.81 ; -3.81,3.31 -3.81,3.81 ; -3.81,4.31 -3.81,3.81 ; -3.31,-3.81 -3.81,-3.81 ; -3.31,3.81 -3.81,3.81 ; -0.5,-1.1 0,-1.1 ; -0.5,0 0,0 ; -0.5,1.1 0,1.1 ; 0,-1.6 0,-1.1 ; 0,-0.6 0,-1.1 ; 0,-0.5 0,0 ; 0,0.5 0,0 ; 0,0.6 0,1.1 ; 0,1.6 0,1.1 ; 0.5,-1.1 0,-1.1 ; 0.5,0 0,0 ; 0.5,1.1 0,1.1 ; 3.31,-3.81 3.81,-3.81 ; 3.31,3.81 3.81,3.81 ; 3.81,-4.31 3.81,-3.81 ; 3.81,-3.31 3.81,-3.81 ; 3.81,3.31 3.81,3.81 ; 3.81,4.31 3.81,3.81 ; 4.31,-3.81 3.81,-3.81 ; 4.31,3.81 3.81,3.81
Mechanical 14:
  circle w0.1: c0,0 r4.5
  circle w0.1: c0,0 r2.25
  circle w0.1: c0,-1.1 r0.55
  circle w0.1: c0,1.1 r0.55
  circle w0.1: c0,-1.1 r0.35
  circle w0.1: c0,1.1 r0.35
  lines w0.1: -5,-2.527 ccw(c-3.81,-3.81) -2.527,-5 ; -5,2.527 cw(c-3.81,3.81) -2.527,5 ; 2.527,-5 ccw(c3.81,-3.81) 5,-2.527 ; 2.527,5 cw(c3.81,3.81) 5,2.527 ; -5,-4.346 -4.346,-5 4.346,-5 5,-4.346 5,4.346 4.346,5 -4.346,5 -5,4.346 -5,-4.346 ; -0.5,3.666 ccw(c0,0) 0.5,3.666 0.5,4.05 -0.5,4.05 -0.5,3.666
  text "2" at -0.299,-3.308 h1
  text "1" at -0.162,2.293 h1
3D body: height 3.9, standoff -3.7, extent -5.56,-5.56 5.56,5.56
3D body: height 15, standoff -4.5, extent -5,-5 5,5

## LEMO_EZG.0S.302.NLNY [mm] "Serie 0S, 1 Female + 1 Male Contacts, Straight Socket With Key (G)"
height 15.8
pads (6):
  round 1.6 hole 0.9: 1(0,1.1) 2(0,-1.1) 3(-3.81,-3.81) 3(-3.81,3.81) 3(3.81,-3.81) 3(3.81,3.81)
Top Overlay:
  circle w0.2: c0,0 r4.1
  lines w0.2: -3.573,-2.736 cw(c0,0) -3.573,2.736 ; -2.736,-3.573 ccw(c0,0) 2.736,-3.573 ; -2.736,3.573 cw(c0,0) 2.736,3.573 ; 3.573,-2.736 ccw(c0,0) 3.573,2.736 ; -5,-4.293 -5,4.293 -4.293,5 4.293,5 5,4.293 5,-4.293 4.293,-5 -4.293,-5 -5,-4.293 ; -2.25,0 cw(c0,0) 2.25,0 -2.25,0 ; -0.6,3.551 ccw(c0,-0.1) 0.6,3.551 0.6,3.9 -0.6,3.9 -0.6,3.551
  text "1" at 2.764,0.091 h1
  text "2" at 1.326,-1.598 h1
Mechanical 8:
  circle w0.1: c-3.81,-3.81 r1.2
  circle w0.1: c3.81,-3.81 r1.2
  circle w0.1: c3.81,3.81 r1.2
  circle w0.1: c-3.81,3.81 r1.2
  lines w0.1: -4.31,-3.81 -3.81,-3.81 ; -4.31,3.81 -3.81,3.81 ; -3.81,-4.31 -3.81,-3.81 ; -3.81,-3.31 -3.81,-3.81 ; -3.81,3.31 -3.81,3.81 ; -3.81,4.31 -3.81,3.81 ; -3.31,-3.81 -3.81,-3.81 ; -3.31,3.81 -3.81,3.81 ; -0.5,-1.1 0,-1.1 ; -0.5,0 0,0 ; -0.5,1.1 0,1.1 ; 0,-1.6 0,-1.1 ; 0,-0.6 0,-1.1 ; 0,-0.5 0,0 ; 0,0.5 0,0 ; 0,0.6 0,1.1 ; 0,1.6 0,1.1 ; 0.5,-1.1 0,-1.1 ; 0.5,0 0,0 ; 0.5,1.1 0,1.1 ; 3.31,-3.81 3.81,-3.81 ; 3.31,3.81 3.81,3.81 ; 3.81,-4.31 3.81,-3.81 ; 3.81,-3.31 3.81,-3.81 ; 3.81,3.31 3.81,3.81 ; 3.81,4.31 3.81,3.81 ; 4.31,-3.81 3.81,-3.81 ; 4.31,3.81 3.81,3.81
Mechanical 14:
  circle w0.1: c0,-1.1 r0.5
  circle w0.1: c0,1.1 r0.55
  circle w0.1: c0,0 r4.1
  circle w0.1: c0,0 r4.5
  lines w0.1: -0.5,-1.1 0.5,-1.1 ; -0.49,-1.2 0.49,-1.2 ; -0.49,-1 0.49,-1 ; -0.458,-1.3 0.458,-1.3 ; -0.458,-0.9 0.458,-0.9 ; -0.4,-1.4 0.4,-1.4 ; -0.4,-0.8 0.4,-0.8 ; -0.3,-1.5 0.3,-1.5 ; -0.3,-0.7 0.3,-0.7 ; -5,-4.293 -5,4.293 -4.293,5 4.293,5 5,4.293 5,-4.293 4.293,-5 -4.293,-5 -5,-4.293 ; -2.25,0 cw(c0,0) 2.25,0 -2.25,0 ; -0.6,3.551 ccw(c0,-0.1) 0.6,3.551 0.6,3.9 -0.6,3.9 -0.6,3.551
  text "1" at 2.764,0.091 h1
  text "2" at 1.326,-1.598 h1
3D body: height 15.8, standoff -4, extent -5.01,-5.004 5.004,5.002

## MENTOR_1813.2235 [mm] "2 x Right Angled Test Jack 2mm"
height 9.95
pads (3):
  round 1.5 hole 0.8: 1(5.08,-1.27) 2(0,1.27)
  round 1 hole 1.2 unplated mask+0.2: 3(0,-1.27)
Top Overlay:
  lines w0.2: -6.84,-1.9 -9.94,-1.9 ; -6.84,1.9 -9.94,1.9 ; -0.39,-1.975 -0.5,-1.975 -0.5,-2.475 -6.84,-2.475 -6.84,2.475 -0.5,2.475 -0.5,2.975 -0.39,2.975 ; 0.39,-1.975 0.5,-1.975 0.5,-2.475 6.66,-2.475 6.66,2.475 0.5,2.475 0.5,2.975 0.39,2.975 ; -9.94,-1.9 -10.34,-1.5 -10.34,1.5 -9.94,1.9 ; -9.94,-1.9 -9.94,1.9
  text "BOT" at -3.81,0.635 h1
  text "TOP" at 1.27,-1.905 h1
Mechanical 14:
  lines w0.1: -6.84,-1.9 -9.94,-1.9 ; -6.84,1.9 -9.94,1.9 ; -9.94,-1.9 -10.34,-1.5 -10.34,1.5 -9.94,1.9 ; -9.94,-1.9 -9.94,1.9 ; -0.5,2.975 0.5,2.975 ; -0.5,2.975 -0.5,2.475 -6.84,2.475 -6.84,-2.475 -0.5,-2.475 -0.5,-1.975 0.5,-1.975 0.5,-2.475 6.66,-2.475 6.66,2.475 0.5,2.475 0.5,2.975 ; -0.5,2.975 0.5,2.975
3D body: height 9.95, standoff -3.2, extent -10.3,-2.4 6.7,3.05

## MENTOR_1880.2011 [mm] "2 x Test Jack 2mm + 1 x Red LED 3mm PCB Edge Mounting"
height 15
pads (5):
  round 1.5 hole 0.8: 1(7.62,1.27) 2(7.62,-1.27) 3(5.08,-1.27) 4(0,1.27)
  round 1 hole 1.2 unplated mask+0.2: 5(0,-1.27)
Top Overlay:
  lines w0.2: -6.84,-1.9 -9.94,-1.9 ; -6.84,-1.4 -7.94,-1.4 cw(c-7.94,0) -7.94,1.4 -6.84,1.4 ; -6.84,1.9 -9.94,1.9 ; -0.39,-2.025 -0.5,-2.025 -0.5,-2.525 -6.84,-2.525 -6.84,2.525 -0.5,2.525 -0.5,3.025 -0.39,3.025 ; 0.39,-2.025 0.5,-2.025 0.5,-2.525 9.16,-2.525 9.16,-1.905 ; 0.39,3.025 0.5,3.025 0.5,2.525 9.16,2.525 9.16,1.905 ; 8.255,0.318 9.525,0.318 ; 8.573,-1.27 8.89,-1.27 ; 8.573,1.27 8.89,1.27 8.89,0.318 ; 8.62,-1.27 8.89,-1.27 ; 8.89,-0.318 8.89,-1.27 ; -9.94,-1.9 -9.94,1.9 ; -9.94,-1.9 -10.34,-1.5 -10.34,1.5 -9.94,1.9 ; 8.89,0.318 8.255,-0.318 9.525,-0.318 8.89,0.318
  text "BOT" at -3.81,0.889 h1
  text "TOP" at 1.27,-1.778 h1
  text "A" at 9.906,-2.159 h1
  text "C" at 9.906,1.143 h1
Mechanical 14:
  lines w0.1: -6.84,-1.9 -9.94,-1.9 ; -6.84,1.9 -9.94,1.9 ; 8.255,0.318 9.525,0.318 ; 8.573,-1.27 8.89,-1.27 ; 8.573,1.27 8.89,1.27 8.89,0.318 ; 8.62,-1.27 8.89,-1.27 ; 8.89,-0.318 8.89,-1.27 ; 9.16,-1.905 9.16,-2.525 0.5,-2.525 0.5,-2.025 -0.5,-2.025 -0.5,-2.525 -6.84,-2.525 -6.84,2.525 -0.5,2.525 -0.5,3.025 0.5,3.025 0.5,2.525 9.16,2.525 9.16,1.905 ; -9.94,-1.9 -9.94,1.9 ; -9.94,-1.9 -10.34,-1.5 -10.34,1.5 -9.94,1.9 ; -7.94,-1.4 cw(c-7.94,0) -7.94,1.4 ; -7.94,-1.4 -6.84,-1.4 -7.94,-1.4 ; -7.94,1.4 -6.84,1.4 -7.94,1.4 ; 8.89,0.318 8.255,-0.318 9.525,-0.318 8.89,0.318
  text "A" at 9.906,-2.159 h1
  text "TOP" at 1.27,-1.778 h1
  text "BOT" at -3.81,0.889 h1
  text "C" at 9.906,1.143 h1
3D body: height 15, standoff -3.2, extent -10.3,-2.575 9.2,2.975

## MENTOR_1880.2031 [mm] "6 x Test Jack 2mm + 3 x Red LED 3mm PCB Edge Mounting"
height 15
pads (15):
  round 1.5 hole 0.8: 1(7.62,6.35) 2(7.62,3.81) 3(5.08,3.81) 4(0,6.35) 5(7.62,1.27) 6(7.62,-1.27) 7(5.08,-1.27) 8(0,1.27) 9(7.62,-3.81) 10(7.62,-6.35) 11(5.08,-6.35) 12(0,-3.81)
  round 1 hole 1.2 unplated mask+0.2: 13(0,3.81) 14(0,-1.27) 15(0,-6.35)
Top Overlay:
  lines w0.2: -6.84,-6.98 -9.94,-6.98 ; -6.84,-6.48 -7.94,-6.48 cw(c-7.94,-5.08) -7.94,-3.68 -6.84,-3.68 ; -6.84,-3.18 -9.94,-3.18 ; -6.84,-1.9 -9.94,-1.9 ; -6.84,-1.4 -7.94,-1.4 cw(c-7.94,0) -7.94,1.4 -6.84,1.4 ; -6.84,1.9 -9.94,1.9 ; -6.84,3.18 -9.94,3.18 ; -6.84,3.68 -7.94,3.68 cw(c-7.94,5.08) -7.94,6.48 -6.84,6.48 ; -6.84,6.98 -9.94,6.98 ; -3.175,-0.635 -3.175,-3.81 -2.667,-3.81 ; -3.175,3.175 -3.175,6.35 -2.667,6.35 ; -0.39,-7.105 -0.5,-7.105 -0.5,-7.605 -6.84,-7.605 -6.84,7.605 -0.5,7.605 -0.5,8.105 -0.39,8.105 ; 0.39,-7.105 0.5,-7.105 0.5,-7.605 9.16,-7.605 9.16,-6.985 ; 0.39,8.105 0.5,8.105 0.5,7.605 9.16,7.605 9.16,6.985 ; 1.905,-3.175 1.905,-6.35 2.413,-6.35 ; 1.905,0.635 1.905,3.81 2.413,3.81 ; 8.255,-4.762 9.525,-4.762 ; 8.255,0.318 9.525,0.318 ; 8.255,5.398 9.525,5.398 ; 8.573,-6.35 8.89,-6.35 ; 8.573,-3.81 8.89,-3.81 8.89,-4.762 ; 8.573,-1.27 8.89,-1.27 ; 8.573,1.27 8.89,1.27 8.89,0.318 ; 8.573,3.81 8.89,3.81 ; 8.573,6.35 8.89,6.35 8.89,5.398 ; 8.62,-6.35 8.89,-6.35 ; 8.62,-1.27 8.89,-1.27 ; 8.62,3.81 8.89,3.81 ; 8.89,-5.398 8.89,-6.35 ; 8.89,-0.318 8.89,-1.27 ; 8.89,4.762 8.89,3.81 ; 9.16,-3.175 9.16,-1.905 ; 9.16,1.905 9.16,3.175 ; -9.94,-6.98 -9.94,-3.18 ; -9.94,-6.98 -10.34,-6.58 -10.34,-3.58 -9.94,-3.18 ; -9.94,-1.9 -10.34,-1.5 -10.34,1.5 -9.94,1.9 ; -9.94,-1.9 -9.94,1.9 ; -9.94,3.18 -9.94,6.98 ; -9.94,3.18 -10.34,3.58 -10.34,6.58 -9.94,6.98 ; 8.89,-4.762 8.255,-5.398 9.525,-5.398 8.89,-4.762 ; 8.89,0.318 9.525,-0.318 8.255,-0.318 8.89,0.318 ; 8.89,5.398 8.255,4.762 9.525,4.762 8.89,5.398
  text "BOT" at -2.667,0 h1
  text "C" at -1.116,6.091 h1
  text "I" at -1.116,-3.942 h1
  text "F" at -1.116,0.932 h1
  text "C" at 9.906,0.643 h1
  text "A" at 9.906,-1.659 h1
  text "E" at 3.964,-1.608 h1
  text "H" at 3.964,-6.609 h1
  text "A" at 9.906,-6.739 h1
  text "C" at 9.906,-4.437 h1
  text "B" at 3.964,3.551 h1
  text "A" at 9.906,3.421 h1
  text "C" at 9.906,5.723 h1
  text "A" at 7.012,4.695 h1
  text "D" at 7.012,-0.258 h1
  text "G" at 7.012,-5.465 h1
  text "TOP" at 2.413,-2.54 h1
Mechanical 14:
  lines w0.1: -6.84,-6.98 -9.94,-6.98 ; -6.84,-3.18 -9.94,-3.18 ; -6.84,-1.9 -9.94,-1.9 ; -6.84,1.9 -9.94,1.9 ; -6.84,3.18 -9.94,3.18 ; -6.84,6.98 -9.94,6.98 ; -3.175,-0.635 -3.175,-3.81 -2.667,-3.81 ; -3.175,3.175 -3.175,6.35 -2.667,6.35 ; 1.905,-3.175 1.905,-6.35 2.413,-6.35 ; 1.905,0.635 1.905,3.81 2.413,3.81 ; 8.255,-4.762 9.525,-4.762 ; 8.255,0.318 9.525,0.318 ; 8.255,5.398 9.525,5.398 ; 8.573,-6.35 8.89,-6.35 ; 8.573,-3.81 8.89,-3.81 8.89,-4.762 ; 8.573,-1.27 8.89,-1.27 ; 8.573,1.27 8.89,1.27 8.89,0.318 ; 8.573,3.81 8.89,3.81 ; 8.573,6.35 8.89,6.35 8.89,5.398 ; 8.62,-6.35 8.89,-6.35 ; 8.62,-1.27 8.89,-1.27 ; 8.62,3.81 8.89,3.81 ; 8.89,-5.398 8.89,-6.35 ; 8.89,-0.318 8.89,-1.27 ; 8.89,4.762 8.89,3.81 ; 9.16,-6.985 9.16,-7.605 0.5,-7.605 0.5,-7.105 -0.5,-7.105 -0.5,-7.605 -6.84,-7.605 -6.84,7.605 -0.5,7.605 -0.5,8.105 0.5,8.105 0.5,7.605 9.16,7.605 9.16,6.985 ; 9.16,-3.175 9.16,-1.905 ; 9.16,1.905 9.16,3.175 ; -9.94,-6.98 -9.94,-3.18 ; -9.94,-6.98 -10.34,-6.58 -10.34,-3.58 -9.94,-3.18 ; -9.94,-1.9 -10.34,-1.5 -10.34,1.5 -9.94,1.9 ; -9.94,-1.9 -9.94,1.9 ; -9.94,3.18 -9.94,6.98 ; -9.94,3.18 -10.34,3.58 -10.34,6.58 -9.94,6.98 ; -7.94,-6.48 cw(c-7.94,-5.08) -7.94,-3.68 ; -7.94,-6.48 -6.84,-6.48 -7.94,-6.48 ; -7.94,-3.68 -6.84,-3.68 -7.94,-3.68 ; -7.94,-1.4 cw(c-7.94,0) -7.94,1.4 ; -7.94,-1.4 -6.84,-1.4 -7.94,-1.4 ; -7.94,1.4 -6.84,1.4 -7.94,1.4 ; -7.94,3.68 cw(c-7.94,5.08) -7.94,6.48 ; -7.94,3.68 -6.84,3.68 -7.94,3.68 ; -7.94,6.48 -6.84,6.48 -7.94,6.48 ; 8.89,-4.762 8.255,-5.398 9.525,-5.398 8.89,-4.762 ; 8.89,0.318 9.525,-0.318 8.255,-0.318 8.89,0.318 ; 8.89,5.398 8.255,4.762 9.525,4.762 8.89,5.398
  text "BOT" at -2.667,0 h1
  text "C" at -1.116,6.091 h1
  text "I" at -1.116,-3.942 h1
  text "F" at -1.116,0.932 h1
  text "E" at 3.964,-1.608 h1
  text "A" at 9.906,-1.659 h1
  text "C" at 9.906,0.643 h1
  text "C" at 9.906,-4.437 h1
  text "A" at 9.906,-6.739 h1
  text "H" at 3.964,-6.609 h1
  text "C" at 9.906,5.723 h1
  text "A" at 9.906,3.421 h1
  text "B" at 3.964,3.551 h1
  text "A" at 7.012,4.695 h1
  text "D" at 7.012,-0.258 h1
  text "G" at 7.012,-5.465 h1
  text "TOP" at 2.413,-2.54 h1
3D body: height 15, standoff -3.1, extent -10.34,-7.6 9.16,8.1

## MENTOR_1880.7011 [mm] "2 x Test Jack 2mm + 1 x Yellow LED 3mm PCB Edge Mounting"
height 15
pads (5):
  round 1.5 hole 0.8: 1(7.62,1.27) 2(7.62,-1.27) 3(5.08,-1.27) 4(0,1.27)
  round 1 hole 1.2 unplated mask+0.2: 5(0,-1.27)
Top Overlay:
  lines w0.2: -6.84,-1.9 -9.94,-1.9 ; -6.84,-1.4 -7.94,-1.4 cw(c-7.94,0) -7.94,1.4 -6.84,1.4 ; -6.84,1.9 -9.94,1.9 ; -0.39,-2.025 -0.5,-2.025 -0.5,-2.525 -6.84,-2.525 -6.84,2.525 -0.5,2.525 -0.5,3.025 -0.39,3.025 ; 0.39,-2.025 0.5,-2.025 0.5,-2.525 9.16,-2.525 9.16,-1.905 ; 0.39,3.025 0.5,3.025 0.5,2.525 9.16,2.525 9.16,1.905 ; 8.255,0.318 9.525,0.318 ; 8.573,-1.27 8.89,-1.27 ; 8.573,1.27 8.89,1.27 8.89,0.318 ; 8.62,-1.27 8.89,-1.27 ; 8.89,-0.318 8.89,-1.27 ; -9.94,-1.9 -10.34,-1.5 -10.34,1.5 -9.94,1.9 ; -9.94,-1.9 -9.94,1.9 ; 8.89,0.318 9.525,-0.318 8.255,-0.318 8.89,0.318
  text "C" at 9.906,1.143 h1
  text "A" at 9.906,-2.159 h1
  text "TOP" at 1.27,-1.778 h1
  text "BOT" at -3.81,0.889 h1
Mechanical 14:
  lines w0.1: -6.84,-1.9 -9.94,-1.9 ; -6.84,1.9 -9.94,1.9 ; 8.255,0.318 9.525,0.318 ; 8.573,-1.27 8.89,-1.27 ; 8.573,1.27 8.89,1.27 8.89,0.318 ; 8.62,-1.27 8.89,-1.27 ; 8.89,-0.318 8.89,-1.27 ; 9.16,-1.905 9.16,-2.525 0.5,-2.525 0.5,-2.025 -0.5,-2.025 -0.5,-2.525 -6.84,-2.525 -6.84,2.525 -0.5,2.525 -0.5,3.025 0.5,3.025 0.5,2.525 9.16,2.525 9.16,1.905 ; -9.94,-1.9 -10.34,-1.5 -10.34,1.5 -9.94,1.9 ; -9.94,-1.9 -9.94,1.9 ; -7.94,-1.4 cw(c-7.94,0) -7.94,1.4 ; -7.94,-1.4 -6.84,-1.4 -7.94,-1.4 ; -7.94,1.4 -6.84,1.4 -7.94,1.4 ; 8.89,0.318 9.525,-0.318 8.255,-0.318 8.89,0.318
  text "C" at 9.906,1.143 h1
  text "BOT" at -3.81,0.889 h1
  text "TOP" at 1.27,-1.778 h1
  text "A" at 9.906,-2.159 h1
3D body: height 15, standoff -3.2, extent -10.3,-2.575 9.2,2.975

## MENTOR_1880.7031 [mm] "6 x Test Jack 2mm + 3 x Yellow LED 3mm PCB Edge Mounting"
height 15
pads (15):
  round 1.5 hole 0.8: 1(7.62,6.35) 2(7.62,3.81) 3(5.08,3.81) 4(0,6.35) 5(7.62,1.27) 6(7.62,-1.27) 7(5.08,-1.27) 8(0,1.27) 9(7.62,-3.81) 10(7.62,-6.35) 11(5.08,-6.35) 12(0,-3.81)
  round 1 hole 1.2 unplated mask+0.2: 13(0,3.81) 14(0,-1.27) 15(0,-6.35)
Top Overlay:
  lines w0.2: -6.84,-6.98 -9.94,-6.98 ; -6.84,-6.48 -7.94,-6.48 cw(c-7.94,-5.08) -7.94,-3.68 -6.84,-3.68 ; -6.84,-3.18 -9.94,-3.18 ; -6.84,-1.9 -9.94,-1.9 ; -6.84,-1.4 -7.94,-1.4 cw(c-7.94,0) -7.94,1.4 -6.84,1.4 ; -6.84,1.9 -9.94,1.9 ; -6.84,3.18 -9.94,3.18 ; -6.84,3.68 -7.94,3.68 cw(c-7.94,5.08) -7.94,6.48 -6.84,6.48 ; -6.84,6.98 -9.94,6.98 ; -3.175,-0.635 -3.175,-3.81 -2.667,-3.81 ; -3.175,3.175 -3.175,6.35 -2.667,6.35 ; -0.39,-7.105 -0.5,-7.105 -0.5,-7.605 -6.84,-7.605 -6.84,7.605 -0.5,7.605 -0.5,8.105 -0.39,8.105 ; 0.39,-7.105 0.5,-7.105 0.5,-7.605 9.16,-7.605 9.16,-6.985 ; 0.39,8.105 0.5,8.105 0.5,7.605 9.16,7.605 9.16,6.985 ; 1.905,-3.175 1.905,-6.35 2.413,-6.35 ; 1.905,0.635 1.905,3.81 2.413,3.81 ; 8.255,-4.762 9.525,-4.762 ; 8.255,0.318 9.525,0.318 ; 8.255,5.398 9.525,5.398 ; 8.573,-6.35 8.89,-6.35 ; 8.573,-3.81 8.89,-3.81 8.89,-4.762 ; 8.573,-1.27 8.89,-1.27 ; 8.573,1.27 8.89,1.27 8.89,0.318 ; 8.573,3.81 8.89,3.81 ; 8.573,6.35 8.89,6.35 8.89,5.398 ; 8.62,-6.35 8.89,-6.35 ; 8.62,-1.27 8.89,-1.27 ; 8.62,3.81 8.89,3.81 ; 8.89,-5.398 8.89,-6.35 ; 8.89,-0.318 8.89,-1.27 ; 8.89,4.762 8.89,3.81 ; 9.16,-3.175 9.16,-1.905 ; 9.16,1.905 9.16,3.175 ; -9.94,-6.98 -10.34,-6.58 -10.34,-3.58 -9.94,-3.18 ; -9.94,-6.98 -9.94,-3.18 ; -9.94,-1.9 -9.94,1.9 ; -9.94,-1.9 -10.34,-1.5 -10.34,1.5 -9.94,1.9 ; -9.94,3.18 -10.34,3.58 -10.34,6.58 -9.94,6.98 ; -9.94,3.18 -9.94,6.98 ; 8.89,-4.762 9.525,-5.398 8.255,-5.398 8.89,-4.762 ; 8.89,0.318 8.255,-0.318 9.525,-0.318 8.89,0.318 ; 8.89,5.398 9.525,4.762 8.255,4.762 8.89,5.398
  text "TOP" at 2.413,-2.54 h1
  text "G" at 7.012,-5.465 h1
  text "D" at 7.012,-0.258 h1
  text "A" at 7.012,4.695 h1
  text "C" at 9.906,5.723 h1
  text "A" at 9.906,3.421 h1
  text "B" at 3.964,3.551 h1
  text "C" at 9.906,-4.437 h1
  text "A" at 9.906,-6.739 h1
  text "H" at 3.964,-6.609 h1
  text "E" at 3.964,-1.608 h1
  text "A" at 9.906,-1.659 h1
  text "C" at 9.906,0.643 h1
  text "F" at -1.116,0.932 h1
  text "I" at -1.116,-3.942 h1
  text "C" at -1.116,6.091 h1
  text "BOT" at -2.667,0 h1
Mechanical 14:
  lines w0.1: -6.84,-6.98 -9.94,-6.98 ; -6.84,-3.18 -9.94,-3.18 ; -6.84,-1.9 -9.94,-1.9 ; -6.84,1.9 -9.94,1.9 ; -6.84,3.18 -9.94,3.18 ; -6.84,6.98 -9.94,6.98 ; -3.175,-0.635 -3.175,-3.81 -2.667,-3.81 ; -3.175,3.175 -3.175,6.35 -2.667,6.35 ; 1.905,-3.175 1.905,-6.35 2.413,-6.35 ; 1.905,0.635 1.905,3.81 2.413,3.81 ; 8.255,-4.762 9.525,-4.762 ; 8.255,0.318 9.525,0.318 ; 8.255,5.398 9.525,5.398 ; 8.573,-6.35 8.89,-6.35 ; 8.573,-3.81 8.89,-3.81 8.89,-4.762 ; 8.573,-1.27 8.89,-1.27 ; 8.573,1.27 8.89,1.27 8.89,0.318 ; 8.573,3.81 8.89,3.81 ; 8.573,6.35 8.89,6.35 8.89,5.398 ; 8.62,-6.35 8.89,-6.35 ; 8.62,-1.27 8.89,-1.27 ; 8.62,3.81 8.89,3.81 ; 8.89,-5.398 8.89,-6.35 ; 8.89,-0.318 8.89,-1.27 ; 8.89,4.762 8.89,3.81 ; 9.16,-6.985 9.16,-7.605 0.5,-7.605 0.5,-7.105 -0.5,-7.105 -0.5,-7.605 -6.84,-7.605 -6.84,7.605 -0.5,7.605 -0.5,8.105 0.5,8.105 0.5,7.605 9.16,7.605 9.16,6.985 ; 9.16,-3.175 9.16,-1.905 ; 9.16,1.905 9.16,3.175 ; -9.94,-6.98 -10.34,-6.58 -10.34,-3.58 -9.94,-3.18 ; -9.94,-6.98 -9.94,-3.18 ; -9.94,-1.9 -9.94,1.9 ; -9.94,-1.9 -10.34,-1.5 -10.34,1.5 -9.94,1.9 ; -9.94,3.18 -10.34,3.58 -10.34,6.58 -9.94,6.98 ; -9.94,3.18 -9.94,6.98 ; -7.94,-6.48 cw(c-7.94,-5.08) -7.94,-3.68 ; -7.94,-6.48 -6.84,-6.48 -7.94,-6.48 ; -7.94,-3.68 -6.84,-3.68 -7.94,-3.68 ; -7.94,-1.4 cw(c-7.94,0) -7.94,1.4 ; -7.94,-1.4 -6.84,-1.4 -7.94,-1.4 ; -7.94,1.4 -6.84,1.4 -7.94,1.4 ; -7.94,3.68 cw(c-7.94,5.08) -7.94,6.48 ; -7.94,3.68 -6.84,3.68 -7.94,3.68 ; -7.94,6.48 -6.84,6.48 -7.94,6.48 ; 8.89,-4.762 9.525,-5.398 8.255,-5.398 8.89,-4.762 ; 8.89,0.318 8.255,-0.318 9.525,-0.318 8.89,0.318 ; 8.89,5.398 9.525,4.762 8.255,4.762 8.89,5.398
  text "TOP" at 2.413,-2.54 h1
  text "G" at 7.012,-5.465 h1
  text "D" at 7.012,-0.258 h1
  text "A" at 7.012,4.695 h1
  text "B" at 3.964,3.551 h1
  text "A" at 9.906,3.421 h1
  text "C" at 9.906,5.723 h1
  text "H" at 3.964,-6.609 h1
  text "A" at 9.906,-6.739 h1
  text "C" at 9.906,-4.437 h1
  text "C" at 9.906,0.643 h1
  text "A" at 9.906,-1.659 h1
  text "E" at 3.964,-1.608 h1
  text "F" at -1.116,0.932 h1
  text "I" at -1.116,-3.942 h1
  text "C" at -1.116,6.091 h1
  text "BOT" at -2.667,0 h1
3D body: height 15, standoff -3.1, extent -10.34,-7.6 9.16,8.1